# Altium footprint library Indruino.PcbLib: 383 footprints (part 10 of 24)
Each footprint in its own frame and in the unit in brackets; x right, y up, seen from the top. Pads: shape width x height; smd on the part's side, far side on the other; paste and mask are expansions set on the pad; w line width, h text height; cw(c..) or ccw(c..) is an arc to the next point about the centre after c.
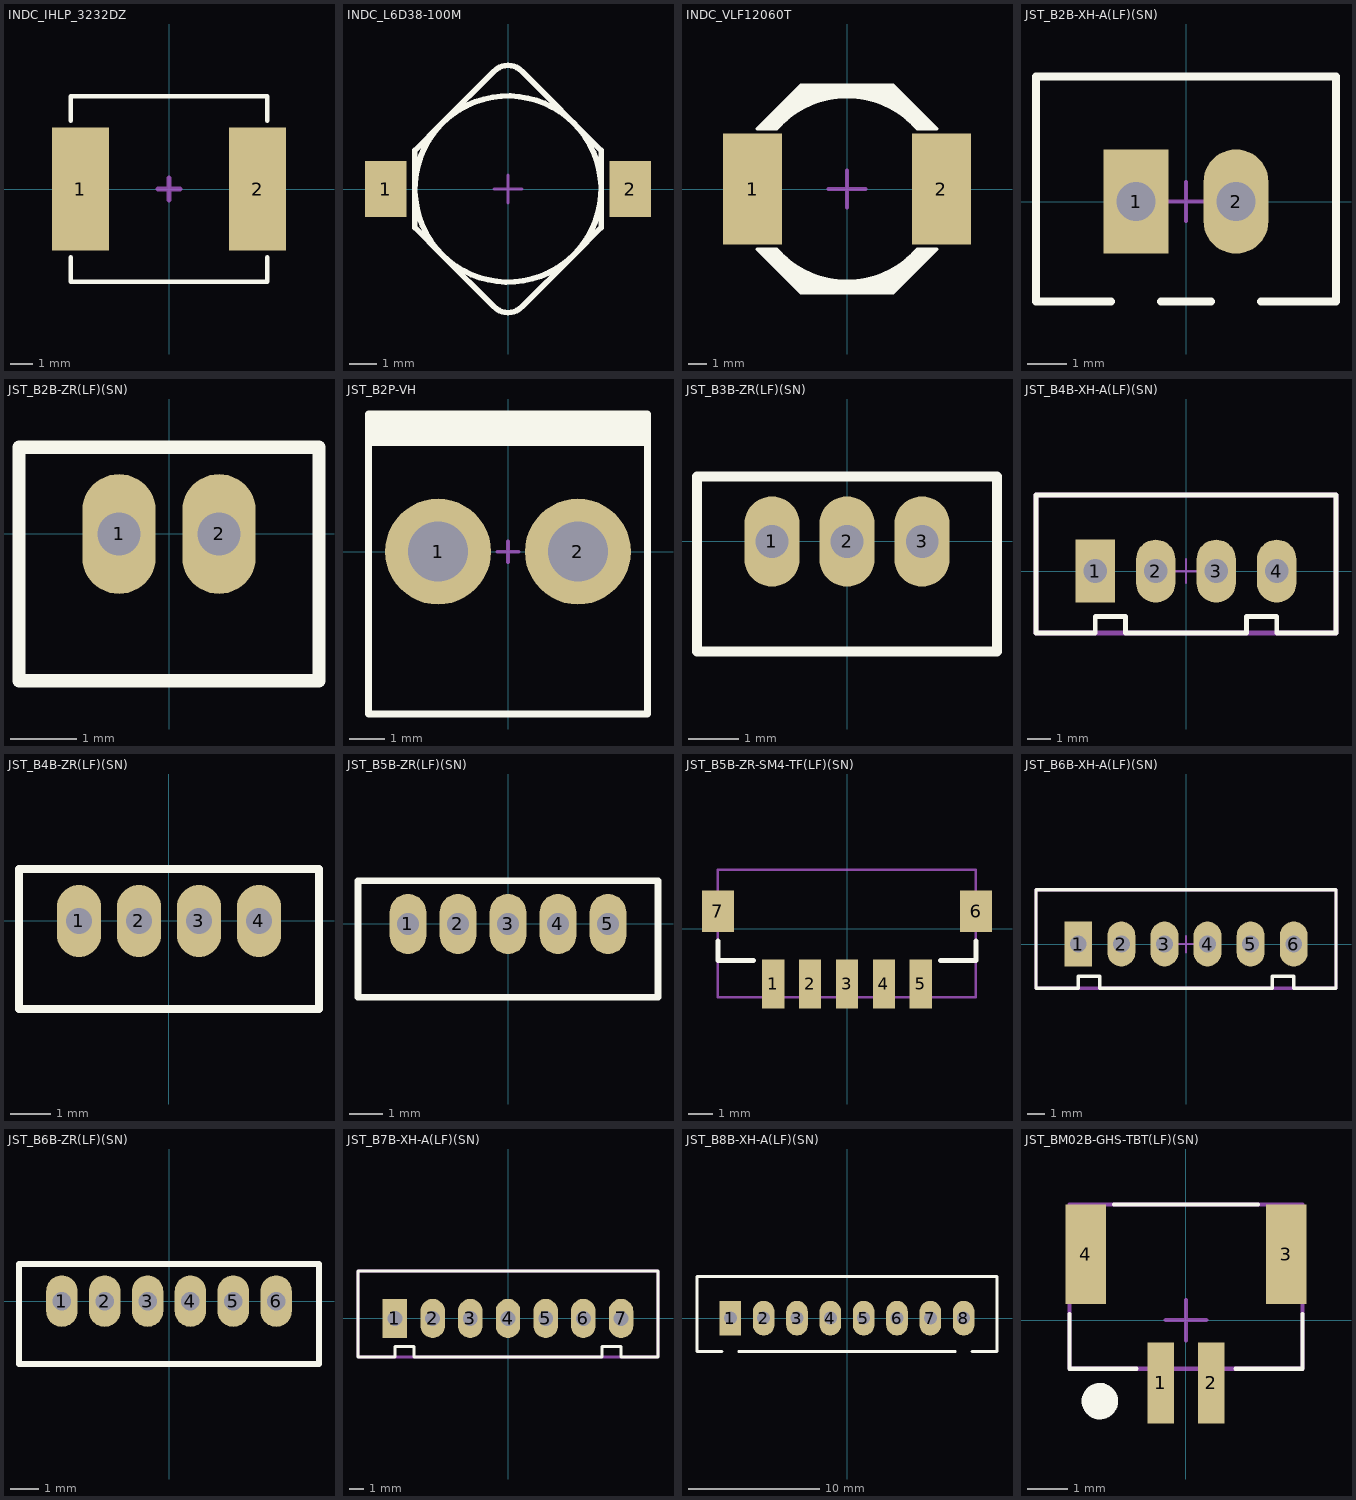
[diagram p9: the footprints below, top view; thin cyan lines are the x and y axes]

## INDC_IHLP_3232DZ [mm] "8.64mm x 8.18mm, Shielded, Nonstandard"
height 4
pads (2):
  rect 2.5x5.4 smd: 1(-3.9,0) 2(3.9,0)
Top Overlay:
  lines w0.2: -4.32,-3 -4.32,-4.09 4.32,-4.09 4.32,-3 ; -4.32,3 -4.32,4.09 4.32,4.09 4.32,3
Mechanical 15:
  lines w0.2: -0.5,0 0.5,0 ; 0,-0.5 0,0.5
3D body "IHLP3232DZ.STEP": height 3.9, standoff 0, extent -4.3,-4.104 4.3,4.09

## INDC_L6D38-100M [mm] "Chip Inductor, Body 6.7x6.7mm, IPC High Density"
height 4
pads (2):
  rect 1.5x2 smd: 1(-4.4,0) 2(4.4,0)
Top Overlay:
  lines w0.2: -0.495,-4.245 ccw(c0,-3.75) 0.495,-4.245 ; -0.495,4.245 cw(c0,3.75) 0.495,4.245 ; -0.494,-4.244 -2.369,-2.369 ; -0.494,4.244 -2.369,2.369 -3.35,1.388 -3.35,-1.388 -2.369,-2.369 ; 0.494,-4.244 2.369,-2.369 3.35,-1.388 3.35,1.388 0.494,4.244 ; -2.369,-2.369 ccw(c0,0) 2.369,2.369 ccw(c0,0) -2.369,-2.369
Mechanical 15:
  lines w0.1: -0.5,0 0.5,0 ; 0,-0.5 0,0.5
3D body: height 4, standoff 0, extent -3.35,-4.45 3.35,4.45

## INDC_VLF12060T [mm] "TDK SMD Shielded Power Inductor, Body 12mx11.7mm"
height 6
pads (2):
  rect 3.2x6 smd: 1(-5.1,0) 2(5.1,0)
Top Overlay:
  region: -4.85,-3.25 -2.5,-5.6 2.5,-5.6 4.85,-3.25 3.8,-3.25 3.619,-3.45 3.226,-3.82 2.796,-4.145 2.334,-4.422 1.844,-4.648 1.333,-4.819 0.806,-4.935 0.27,-4.993 -0.27,-4.993 -0.806,-4.935 -1.333,-4.819 -1.844,-4.648 -2.334,-4.422 -2.796,-4.145 -3.226,-3.82 -3.619,-3.45 -3.8,-3.25
  region: -3.8,3.25 -3.619,3.45 -3.226,3.82 -2.796,4.145 -2.334,4.422 -1.844,4.648 -1.333,4.819 -0.806,4.935 -0.27,4.993 0.27,4.993 0.806,4.935 1.333,4.819 1.844,4.648 2.334,4.422 2.796,4.145 3.226,3.82 3.619,3.45 3.8,3.25 4.85,3.25 2.5,5.6 -2.5,5.6 -4.85,3.25
  lines w0.2: -4.85,-3.25 -2.5,-5.6 2.5,-5.6 4.85,-3.25 3.8,-3.25 cw(c0,0) -3.8,-3.25 -4.85,-3.25 ; -4.85,3.25 -2.5,5.6 2.5,5.6 4.85,3.25 3.8,3.25 ccw(c0,0) -3.8,3.25 -4.85,3.25
Mechanical 15:
  lines w0.2: -1,0 1,0 ; 0,-1 0,1
3D body "VLF12060T-150M5R0.STEP": height 6.05, standoff 0.05, extent -6.002,-5.601 6,5.601

## JST_B2B-XH-A(LF)(SN) [mm]
pads (2):
  rect 1.65x2.65 hole 1: 1(-1.27,0)
  oval 1.65x2.65 hole 1: 2(1.27,0)
Top Overlay:
  lines w0.2: -1.905,-2.54 -3.81,-2.54 -3.81,3.175 3.81,3.175 3.81,-2.54 1.905,-2.54 ; -0.635,-2.54 0.635,-2.54
Mechanical 15:
  lines w0.1: -0.5,0 0.5,0 ; 0,-0.5 0,0.5
3D body "B2B-XH-A.STEP": height 7, standoff -3.4, extent -3.7,-2.565 3.7,3.185

## JST_B2B-ZR(LF)(SN) [mm]
pads (2):
  oval 1.1x1.8 hole 0.65: 1(-0.75,0) 2(0.75,0)
Top Overlay:
  lines w0.2: -2.25,-2.2 2.25,-2.2 2.25,1.3 -2.25,1.3 -2.25,-2.2
Mechanical 13:
  lines w0.1: -2.25,-2.2 2.25,-2.2 2.25,1.3 -2.25,1.3 -2.25,-2.2
3D body "ZHR-2.STEP": height 5.95, standoff 1.15, extent -2.25,-2.15 2.25,1.25
3D body "B2B-ZR.STEP": height 4.5, standoff -2.7, extent -2.25,-2.2 2.25,1.3

## JST_B2P-VH [mm]
pads (2):
  round 3 hole 1.7: 1(-1.98,0) 2(1.98,0)
Top Overlay:
  rectangle: -3.95,3 3.95,3.9
  lines w0.2: -3.95,-4.6 3.95,-4.6 3.95,3.9 -3.95,3.9 -3.95,-4.6
Mechanical 13:
  lines w0.1: -3.95,-4.6 3.95,-4.6 3.95,3.9 -3.95,3.9 -3.95,-4.6
Mechanical 15:
  lines w0.1: -0.3,0 0.3,0 ; 0,-0.3 0,0.3
3D body "User Library-B2P-VH.STEP": height 10.9, standoff -3.7, extent -3.93,-4.6 3.93,3.9

## JST_B3B-ZR(LF)(SN) [mm]
pads (3):
  oval 1.1x1.8 hole 0.65: 1(-1.5,0) 2(0,0) 3(1.5,0)
Top Overlay:
  lines w0.2: -3,-2.2 3,-2.2 3,1.3 -3,1.3 -3,-2.2
Mechanical 13:
  lines w0.1: -3,-2.2 3,-2.2 3,1.3 -3,1.3 -3,-2.2
3D body "ZHR-3.STEP": height 5.9, standoff 1.1, extent -3.006,-2.152 2.994,1.248
3D body "B3B-ZR.STEP": height 4.5, standoff -2.7, extent -3,-2.2 3,1.3

## JST_B4B-XH-A(LF)(SN) [mm]
pads (4):
  rect 1.65x2.65 hole 1: 1(-3.81,0)
  oval 1.65x2.65 hole 1: 2(-1.27,0) 3(1.27,0) 4(3.81,0)
Top Overlay:
  lines w0.2: -6.3,-2.6 -3.81,-2.6 -3.81,-1.905 -2.54,-1.905 -2.54,-2.6 2.54,-2.6 2.54,-1.905 3.81,-1.905 3.81,-2.6 6.3,-2.6 6.3,3.2 -6.3,3.2 -6.3,-2.6
Mechanical 13:
  lines w0.2: -6.3,-2.6 6.3,-2.6 6.3,3.2 -6.3,3.2 -6.3,-2.6
Mechanical 15:
  lines w0.1: -0.5,0 0.5,0 ; 0,-0.5 0,0.5
3D body "B4B-XH-A.STEP": height 7, standoff -3.4, extent -6.2,-2.565 6.2,3.185

## JST_B4B-ZR(LF)(SN) [mm]
pads (4):
  oval 1.1x1.8 hole 0.65: 1(-2.25,0) 2(-0.75,0) 3(0.75,0) 4(2.25,0)
Top Overlay:
  lines w0.2: -3.75,-2.2 3.75,-2.2 3.75,1.3 -3.75,1.3 -3.75,-2.2
Mechanical 13:
  lines w0.1: -3.75,-2.2 3.75,-2.2 3.75,1.3 -3.75,1.3 -3.75,-2.2
3D body "ZHR-4.STEP": height 5.97, standoff 1.17, extent -3.75,-2.15 3.75,1.25
3D body "B4B-ZR.STEP": height 4.5, standoff -2.7, extent -3.75,-2.2 3.75,1.3

## JST_B5B-ZR(LF)(SN) [mm]
pads (5):
  oval 1.1x1.8 hole 0.65: 1(-3,0) 2(-1.5,0) 3(0,0) 4(1.5,0) 5(3,0)
Top Overlay:
  lines w0.2: -4.5,-2.2 4.5,-2.2 4.5,1.3 -4.5,1.3 -4.5,-2.2
Mechanical 13:
  lines w0.1: -4.5,-2.2 4.5,-2.2 4.5,1.3 -4.5,1.3 -4.5,-2.2
3D body "B5B-ZR.STEP": height 4.5, standoff -2.7, extent -4.5,-2.2 4.5,1.3

## JST_B5B-ZR-SM4-TF(LF)(SN) [mm]
pads (7):
  rect 0.9x2 smd: 1(-3,-2.25) 2(-1.5,-2.25) 3(0,-2.25) 4(1.5,-2.25) 5(3,-2.25)
  rect 1.3x1.7 smd: 6(5.25,0.7) 7(-5.25,0.7)
Top Overlay:
  lines w0.2: -5.25,-0.5 -5.25,-1.3 -3.795,-1.3 ; 3.795,-1.3 5.25,-1.3 5.25,-0.5
Mechanical 13:
  lines w0.1: -5.26,-2.8 -5.26,2.4 5.245,2.4 5.245,-2.8 -5.26,-2.8
3D body "B5B-ZR-SM4-TF.STEP": height 5, standoff 0, extent -5.24,-2.79 5.26,2.41
3D body "ZHR-5.STEP": height 6.1, standoff 1.3, extent -4.5,-1.05 4.5,2.35

## JST_B6B-XH-A(LF)(SN) [mm]
pads (6):
  rect 1.65x2.65 hole 1: 1(-6.35,0)
  oval 1.65x2.65 hole 1: 2(-3.81,0) 3(-1.27,0) 4(1.27,0) 5(3.81,0) 6(6.35,0)
Top Overlay:
  lines w0.2: -8.84,-2.6 -8.84,3.2 8.84,3.2 8.84,-2.6 6.35,-2.6 6.35,-1.905 5.08,-1.905 5.08,-2.6 -5.08,-2.6 -5.08,-1.905 -6.35,-1.905 -6.35,-2.6 -8.84,-2.6
Mechanical 13:
  lines w0.2: -8.84,-2.6 -8.84,3.2 8.84,3.2 8.84,-2.6 -8.84,-2.6
Mechanical 15:
  lines w0.1: -0.5,0 0.5,0 ; 0,-0.5 0,0.5
3D body "B6B-XH-A.STEP": height 7, standoff -3.4, extent -8.7,-2.565 8.7,3.185

## JST_B6B-ZR(LF)(SN) [mm]
pads (6):
  oval 1.1x1.8 hole 0.65: 1(-3.75,0) 2(-2.25,0) 3(-0.75,0) 4(0.75,0) 5(2.25,0) 6(3.75,0)
Top Overlay:
  lines w0.2: -5.25,-2.2 -5.25,1.3 5.25,1.3 5.25,-2.2 -5.25,-2.2
Mechanical 13:
  lines w0.1: -5.25,-2.2 -5.25,1.3 5.25,1.3 5.25,-2.2 -5.25,-2.2
3D body "B6B-ZR.STEP": height 4.5, standoff -2.7, extent -5.25,-2.19 5.25,1.31

## JST_B7B-XH-A(LF)(SN) [mm]
pads (7):
  rect 1.65x2.65 hole 1: 1(-7.62,0)
  oval 1.65x2.65 hole 1: 2(-5.08,0) 3(-2.54,0) 4(0,0) 5(2.54,0) 6(5.08,0) 7(7.62,0)
Top Overlay:
  lines w0.2: -10.11,-2.6 -10.11,3.2 10.11,3.2 10.11,-2.6 7.62,-2.6 7.62,-1.905 6.35,-1.905 6.35,-2.6 -6.35,-2.6 -6.35,-1.905 -7.62,-1.905 -7.62,-2.6 -10.11,-2.6
Mechanical 13:
  lines w0.2: -10.11,-2.6 -10.11,3.2 10.11,3.2 10.11,-2.6 -10.11,-2.6
Mechanical 15:
  lines w0.1: -0.5,0 0.5,0 ; 0,-0.5 0,0.5
3D body "B7B-XH-A.STEP": height 7, standoff -3.4, extent -9.95,-2.565 9.95,3.185

## JST_B8B-XH-A(LF)(SN) [mm]
pads (8):
  rect 1.65x2.65 hole 1: 1(-8.89,0)
  oval 1.65x2.65 hole 1: 2(-6.35,0) 3(-3.81,0) 4(-1.27,0) 5(1.27,0) 6(3.81,0) 7(6.35,0) 8(8.89,0)
Top Overlay:
  lines w0.2: -9.525,-2.54 -11.43,-2.54 -11.43,3.175 11.43,3.175 11.43,-2.54 9.525,-2.54 ; -8.255,-2.54 8.255,-2.54
3D body "B8B-XH-A.STEP": height 7, standoff -3.4, extent -11.2,-2.565 11.2,3.185

## JST_BM02B-GHS-TBT(LF)(SN) [mm]
pads (4):
  rect 0.65x2 smd: 1(-0.625,-1.55) 2(0.625,-1.55)
  rect 1x2.45 smd: 3(2.475,1.625) 4(-2.475,1.625)
Top Overlay:
  circle w0.2: c-2.125,-2 r0.35
  region: -2.125,-2.35 -2.195,-2.35 -2.323,-2.297 -2.422,-2.198 -2.475,-2.07 -2.475,-2 -2.475,-1.93 -2.422,-1.802 -2.323,-1.703 -2.195,-1.65 -2.125,-1.65 -2.055,-1.65 -1.927,-1.703 -1.828,-1.802 -1.775,-1.93 -1.775,-2 -1.775,-2.07 -1.828,-2.198 -1.927,-2.297 -2.055,-2.35
  lines w0.1: -2.875,0.15 -2.875,-1.2 -1.225,-1.2 ; -1.775,2.85 1.775,2.85 ; 1.225,-1.2 2.875,-1.2 2.875,0.15
Mechanical 13:
  lines w0.1: -2.875,-1.2 -2.875,2.85 2.875,2.85 2.875,-1.2 -2.875,-1.2
Mechanical 15:
  lines w0.1: -0.5,0 0.5,0 ; 0,-0.5 0,0.5
3D body "GHR-02V-S.STEP": height 7.29, standoff 1.6, extent -1.875,-1.2 1.875,2.95
3D body "BM02B-GHS-TBT.STEP": height 4.18, standoff -0.03, extent -2.875,-2.1 2.875,2.85